# Altium footprint library Dahlia Carrier Board.PcbLib: 99 footprints (part 6 of 7)
Each footprint in its own frame and in the unit in brackets; x right, y up, seen from the top. Pads: shape width x height; smd on the part's side, far side on the other; paste and mask are expansions set on the pad; w line width, h text height; cw(c..) or ccw(c..) is an arc to the next point about the centre after c.
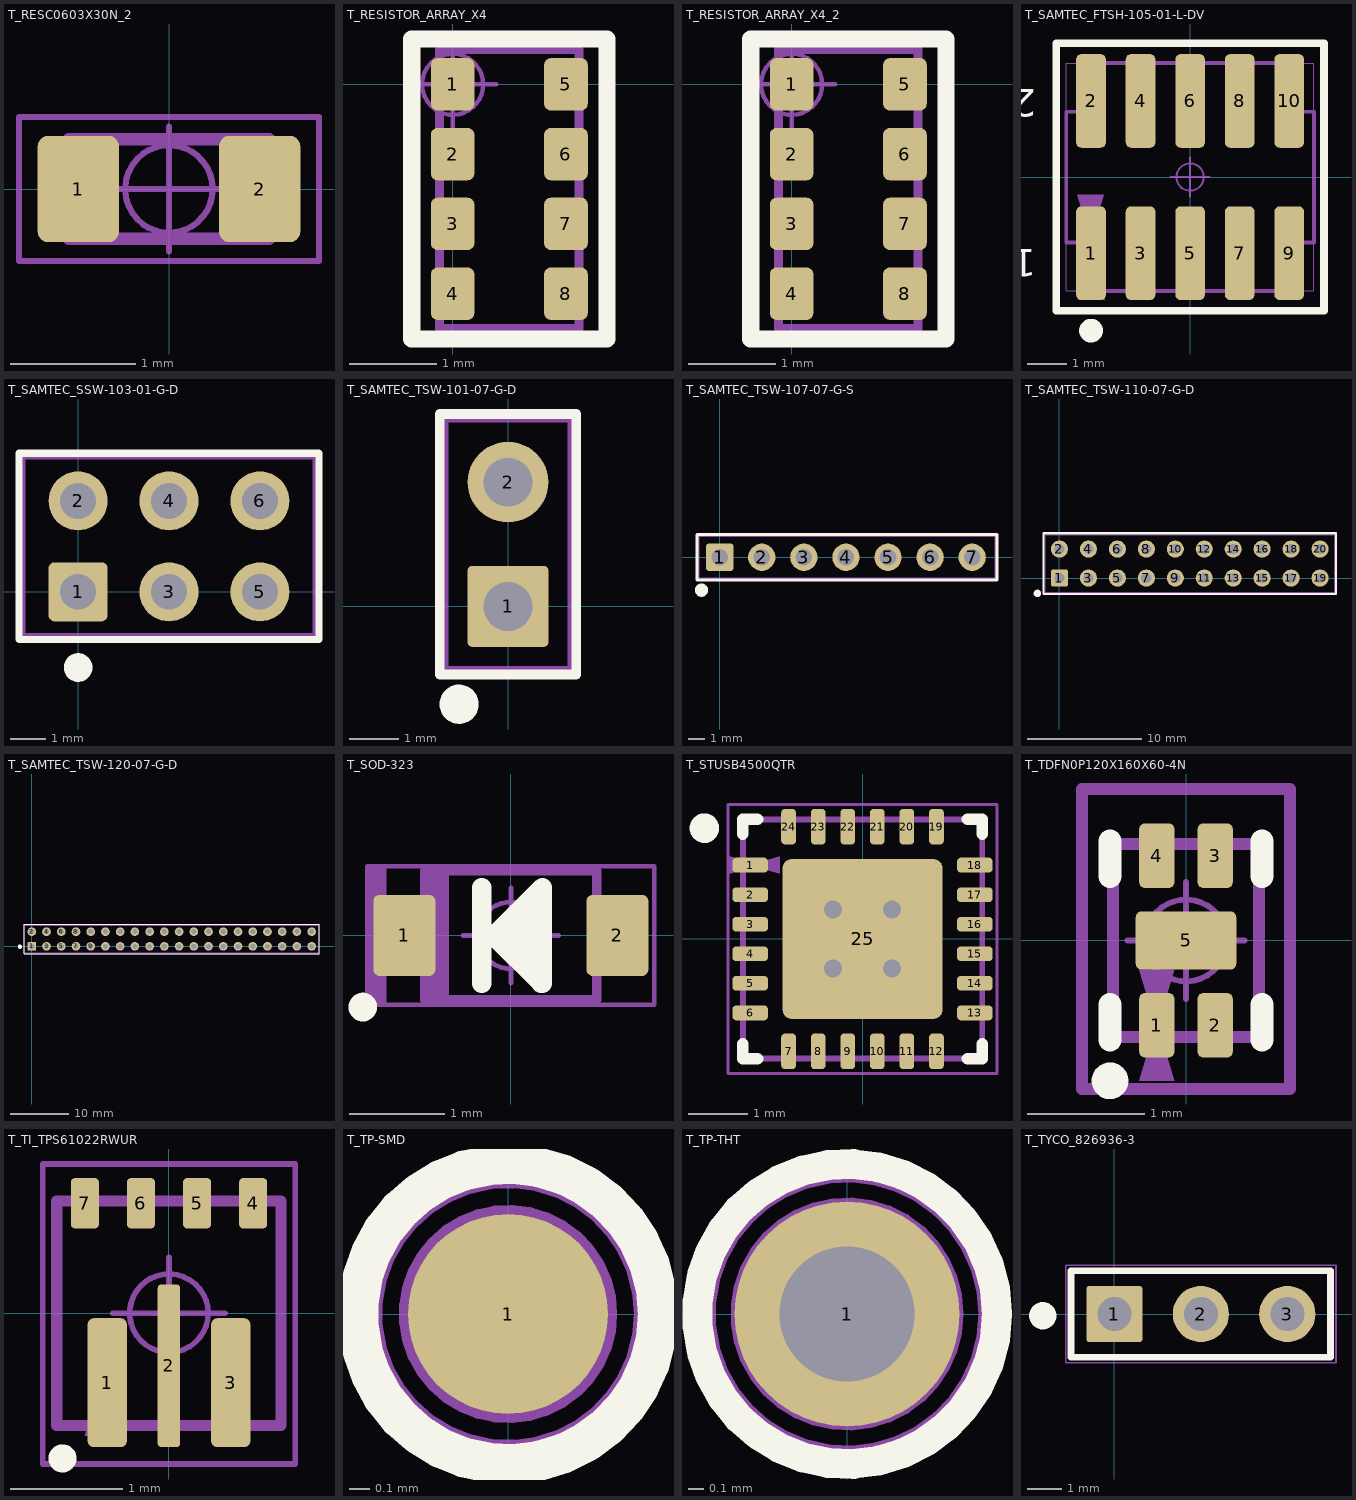
[diagram p5: the footprints below, top view; thin cyan lines are the x and y axes]

## T_RESC0603X30N_2 [mm]
pads (2):
  rrect25% 0.65x0.85 smd: 1(-0.725,0) 2(0.725,0)
Top Component Outline:
  lines w0.05: -1.2,-0.575 -1.2,0.575 1.2,0.575 1.2,-0.575 -1.2,-0.575
Top 3D Body:
  lines w0.001: -0.8,-0.4 -0.8,0.4 0.8,0.4 0.8,-0.4 -0.8,-0.4
Top Dimensions:
  lines w0.1: -0.8,-0.4 -0.8,0.4 0.8,0.4 0.8,-0.4 -0.8,-0.4
Top Component Center:
  circle w0.05: c0,0 r0.35
  lines w0.05: -0.5,0 0.5,0 ; 0,-0.5 0,0.5
Top Assembly:
  text ".Designator" at 0.625,0.25 h0.75
3D body "User Library-RES_1609-0603.step": height 0.56, standoff 0, extent -0.85,-0.4 0.85,0.4

## T_RESISTOR_ARRAY_X4 [mm]
pads (8):
  rrect30% 0.5x0.6 smd: 1(0,0) 2(0,-0.8) 3(0,-1.6) 4(0,-2.4) 5(1.3,0) 6(1.3,-0.8) 7(1.3,-1.6) 8(1.3,-2.4)
Top Overlay:
  lines w0.2: -0.47,-2.92 1.77,-2.92 1.77,0.52 -0.47,0.52 -0.47,-2.92
Top Component Outline:
  lines w0.05: -0.47,-2.92 1.77,-2.92 1.77,0.52 -0.47,0.52 -0.47,-2.92
Top 3D Body:
  lines w0.001: -0.15,-2.8 1.45,-2.8 1.45,0.4 -0.15,0.4 -0.15,-2.8
Top Dimensions:
  lines w0.1: -0.15,-2.8 1.45,-2.8 1.45,0.4 -0.15,0.4 -0.15,-2.8
Top Component Center:
  circle w0.05: c0,0 r0.35
  lines w0.05: -0.5,0 0.5,0 ; 0,-0.5 0,0.5
Top Assembly:
  text ".Designator" at -1,0.8 h0.75
3D body "User Library-R-0603-Array-4-1.STEP": height 0.51, standoff -0.01, extent -0.15,-2.8 1.45,0.4

## T_RESISTOR_ARRAY_X4_2 [mm]
pads (8):
  rrect30% 0.5x0.6 smd: 1(0,0) 2(0,-0.8) 3(0,-1.6) 4(0,-2.4) 5(1.3,0) 6(1.3,-0.8) 7(1.3,-1.6) 8(1.3,-2.4)
Top Overlay:
  lines w0.2: -0.47,-2.92 1.77,-2.92 1.77,0.52 -0.47,0.52 -0.47,-2.92
Top Component Outline:
  lines w0.05: -0.47,-2.92 1.77,-2.92 1.77,0.52 -0.47,0.52 -0.47,-2.92
Top 3D Body:
  lines w0.001: -0.15,-2.8 1.45,-2.8 1.45,0.4 -0.15,0.4 -0.15,-2.8
Top Dimensions:
  lines w0.1: -0.15,-2.8 1.45,-2.8 1.45,0.4 -0.15,0.4 -0.15,-2.8
Top Component Center:
  circle w0.05: c0,0 r0.35
  lines w0.05: -0.5,0 0.5,0 ; 0,-0.5 0,0.5
Top Assembly:
  text ".Designator" at -1,0.8 h0.75
3D body "User Library-R-0603-Array-4-1.STEP": height 0.51, standoff -0.01, extent -0.15,-2.8 1.45,0.4

## T_SAMTEC_FTSH-105-01-L-DV [mm]
height 5.5
pads (10):
  rrect35% 0.76x2.4 smd: 1(-2.54,-1.95) 2(-2.54,1.95) 3(-1.27,-1.95) 4(-1.27,1.95) 5(0,-1.95) 6(0,1.95) 7(1.27,-1.95) 8(1.27,1.95) 9(2.54,-1.95) 10(2.54,1.95)
Top Overlay:
  circle w0.4: c-2.54,-3.937 r0.105
  lines w0.2: -3.429,-3.429 3.429,-3.429 3.429,3.429 -3.429,3.429 -3.429,-3.429
  text "2" at -3.95,2.25 h0.7
  text "1" at -3.95,-1.85 h0.7
Top Component Outline:
  region: -2.185,-3.15 -2.525,-2.015 -2.865,-3.15
  lines w0.05: -3.429,-3.429 3.429,-3.429 3.429,3.429 -3.429,3.429 -3.429,-3.429
Top 3D Body:
  lines w0.001: -3.175,-2.921 3.175,-2.921 3.175,2.921 -3.175,2.921 -3.175,-2.921 ; -3.175,-1.675 -3.175,1.675 -2.55,1.675 -2.55,2.925 2.53,2.925 2.53,1.675 3.175,1.675 3.175,-1.675 2.53,-1.675 2.53,-2.925 -2.55,-2.925 -2.55,-1.675 -3.175,-1.675
Top Dimensions:
  region: -2.89,-0.45 -2.55,-1.585 -2.21,-0.45
  lines w0.1: -3.175,-1.675 -3.175,1.675 -2.55,1.675 -2.55,2.925 2.53,2.925 2.53,1.675 3.175,1.675 3.175,-1.675 2.53,-1.675 2.53,-2.925 -2.55,-2.925 -2.55,-1.675 -3.175,-1.675
Top Component Center:
  circle w0.05: c0,0 r0.35
  lines w0.05: -0.5,0 0.5,0 ; 0,-0.5 0,0.5
Top Assembly:
  text ".Designator" at -0.425,-0.125 h0.75
3D body "FTSH-105-01-L-DV-K_2_14.stp": height 6.1, standoff -0.02, extent -3.175,-2.921 3.175,2.921

## T_SAMTEC_SSW-103-01-G-D [mm]
height 13.83
pads (6):
  rrect20% 1.65x1.65 hole 1: 1(0,0)
  round 1.65 hole 1: 2(0,2.54) 3(2.54,0) 4(2.54,2.54) 5(5.08,0) 6(5.08,2.54)
Top Overlay:
  circle w0.4: c0,-2.115 r0.2
  lines w0.2: -1.65,-1.33 -1.65,3.87 6.73,3.87 6.73,-1.33 -1.65,-1.33
Top Component Outline:
  lines w0.05: -1.625,-1.305 6.705,-1.305 6.705,3.845 -1.625,3.845 -1.625,-1.305
Top 3D Body:
  lines w0.001: -1.525,-1.205 6.605,-1.205 6.605,3.745 -1.525,3.745 -1.525,-1.205
Top Dimensions:
  lines w0.1: -1.525,-1.2 -1.525,3.75 6.6,3.75 6.6,-1.2 -1.525,-1.2
Top Component Center:
  circle w0.05: c0,0 r0.35
  lines w0.05: -0.5,0 0.5,0 ; 0,-0.5 0,0.5
Top Assembly:
  text ".Designator" at 0.875,4.225 h0.75
3D body "Samtec-SSW-103-01-G-D.step": height 8.52, standoff -2.63, extent -1.524,-1.206 6.604,3.747

## T_SAMTEC_TSW-101-07-G-D [mm]
height 5.5
pads (2):
  rrect10% 1.65x1.65 hole 1: 1(0,0)
  round 1.65 hole 1: 2(0,2.54)
Top Overlay:
  circle w0.4: c-1,-2 r0.2
  lines w0.2: -1.395,-1.395 -1.395,3.935 1.395,3.935 1.395,-1.395 -1.395,-1.395
Top Component Outline:
  lines w0.05: -1.37,-1.37 1.37,-1.37 1.37,3.91 -1.37,3.91 -1.37,-1.37
Top 3D Body:
  lines w0.001: -1.27,-1.27 -1.27,3.81 1.27,3.81 1.27,-1.27 -1.27,-1.27
Top Dimensions:
  lines w0.1: -1.27,-1.27 1.27,-1.27 1.27,3.81 -1.27,3.81 -1.27,-1.27
Top Component Center:
  circle w0.05: c0,0 r0.35
  lines w0.05: -0.5,0 0.5,0 ; 0,-0.5 0,0.5
Top Assembly:
  text ".Designator" at -0.27,1.755 h0.75
3D body "Samtec-TSW-101-07-G-D.step": height 8.4, standoff -2.52, extent -1.27,-1.27 1.27,3.81

## T_SAMTEC_TSW-107-07-G-S [mm]
height 13.83
pads (7):
  rrect20% 1.65x1.65 hole 1: 1(0,0)
  round 1.65 hole 1: 2(2.54,0) 3(5.08,0) 4(7.62,0) 5(10.16,0) 6(12.7,0) 7(15.24,0)
Top Overlay:
  circle w0.4: c-1.102,-1.985 r0.2
  lines w0.2: -1.372,-1.372 16.739,-1.372 16.739,1.372 -1.372,1.372 -1.372,-1.372
Top Component Outline:
  lines w0.05: -1.372,-1.372 -1.372,1.372 16.739,1.372 16.739,-1.372 -1.372,-1.372
Top 3D Body:
  lines w0.001: -1.27,-1.27 16.637,-1.27 16.637,1.27 -1.27,1.27 -1.27,-1.27
Top Dimensions:
  lines w0.1: -1.27,-1.27 16.637,-1.27 16.637,1.27 -1.27,1.27 -1.27,-1.27
Top Component Center:
  circle w0.05: c0,0 r0.35
  lines w0.05: -0.5,0 0.5,0 ; 0,-0.5 0,0.5
Top Assembly:
  text ".Designator" at 7.075,-0.465 h0.75
3D body "TSW-107-07-G-S.stp": height 8.38, standoff -2.54, extent -1.27,-1.27 16.637,1.27

## T_SAMTEC_TSW-110-07-G-D [mm]
height 13.83
pads (20):
  rrect20% 1.5x1.5 hole 0.9: 1(0,0)
  round 1.5 hole 0.9: 2(0,2.54) 3(2.54,0) 4(2.54,2.54) 5(5.08,0) 6(5.08,2.54) 7(7.62,0) 8(7.62,2.54) 9(10.16,0) 10(10.16,2.54) 11(12.7,0) 12(12.7,2.54) 13(15.24,0) 14(15.24,2.54) 15(17.78,0) 16(17.78,2.54) 17(20.32,0) 18(20.32,2.54) 19(22.86,0) 20(22.86,2.54)
Top Overlay:
  circle w0.4: c-1.935,-1.35 r0.125
  lines w0.2: -1.395,-1.395 24.257,-1.395 24.257,3.935 -1.395,3.935 -1.395,-1.395
Top Component Outline:
  lines w0.05: -1.37,-1.37 24.257,-1.37 24.257,3.91 -1.37,3.91 -1.37,-1.37
Top 3D Body:
  lines w0.001: -1.27,-1.27 24.13,-1.27 24.13,3.81 -1.27,3.81 -1.27,-1.27
Top Dimensions:
  lines w0.1: -1.27,-1.27 24.13,-1.27 24.13,3.81 -1.27,3.81 -1.27,-1.27
Top Component Center:
  circle w0.05: c0,0 r0.35
  lines w0.05: -0.5,0 0.5,0 ; 0,-0.5 0,0.5
Top Assembly:
  text ".Designator" at 10.54,1.05 h0.75
3D body "Samtec-TSW-110-07-G-D.step": height 8.4, standoff -2.52, extent -1.27,-1.27 24.13,3.81

## T_SAMTEC_TSW-120-07-G-D [mm] "Header, 2x20 Pins, 2.54 mm pitch, male"
height 8.51
pads (40):
  rrect20% 1.5x1.5 hole 0.9: 1(0,0)
  round 1.5 hole 0.9: 2(0,2.54) 3(2.54,0) 4(2.54,2.54) 5(5.08,0) 6(5.08,2.54) 7(7.62,0) 8(7.62,2.54) 9(10.16,0) 10(10.16,2.54) 11(12.7,0) 12(12.7,2.54) 13(15.24,0) 14(15.24,2.54) 15(17.78,0) 16(17.78,2.54) 17(20.32,0) 18(20.32,2.54) 19(22.86,0) 20(22.86,2.54) 21(25.4,0) 22(25.4,2.54) 23(27.94,0) 24(27.94,2.54) 25(30.48,0) 26(30.48,2.54) 27(33.02,0) 28(33.02,2.54) 29(35.56,0) 30(35.56,2.54) 31(38.1,0) 32(38.1,2.54) 33(40.64,0) 34(40.64,2.54) 35(43.18,0) 36(43.18,2.54) 37(45.72,0) 38(45.72,2.54) 39(48.26,0) 40(48.26,2.54)
Top Overlay:
  circle w0.4: c-2.04,-0.05 r0.168
  lines w0.2: -1.27,-1.27 49.53,-1.27 49.53,3.81 -1.27,3.81 -1.27,-1.27
Top Component Outline:
  circle w0.05: c0,0 r0.35
  lines w0.05: -1.27,-1.14 49.53,-1.14 49.53,3.68 -1.27,3.68 -1.27,-1.137 ; -0.5,0 0.5,0 ; 0,-0.5 0,0.5
Top 3D Body:
  lines w0.001: -1.27,-1.27 49.53,-1.27 49.53,3.81 -1.27,3.81 -1.27,-1.27
Top Dimensions:
  lines w0.1: -1.27,-1.245 49.53,-1.245 49.53,3.81 -1.27,3.81 -1.27,-1.245
Top Component Center:
  circle w0.05: c0,0 r0.35
  lines w0.05: -0.5,0 0.5,0 ; 0,-0.5 0,0.5
Top Assembly:
  text ".Designator" at 25.019,4.191 h0.75
3D body "TSW-120-07-G-D_2_14.stp": height 8.38, standoff -2.54, extent -1.27,-1.27 49.53,3.81

## T_SOD-323 [mm]
pads (2):
  rrect20% 0.65x0.85 smd: 1(-1.115,0) 2(1.115,0)
Top Overlay:
  circle w0.2: c-1.55,-0.75 r0.05
  lines w0.2: -0.305,-0.502 -0.305,0.502 ; 0.051,-0.21 0.051,0.197 ; 0.203,-0.351 0.203,0.349 ; 0.318,-0.502 -0.178,-0.006 0.33,0.502 0.33,-0.502
Top Component Outline:
  rectangle: -1.5,-0.725 -1.3,0.725
  lines w0.05: -1.5,-0.725 1.5,-0.725 1.5,0.725 -1.5,0.725 -1.5,-0.725
Top 3D Body:
  lines w0.001: -0.9,-0.2 -1.35,-0.2 -1.35,0.2 -0.9,0.2 ; 0.9,-0.2 1.35,-0.2 1.35,0.2 0.9,0.2 ; -0.9,-0.675 0.9,-0.675 0.9,0.675 -0.9,0.675 -0.9,-0.675
Top Dimensions:
  rectangle: -0.9,-0.675 -0.65,0.675
  lines w0.1: -0.9,-0.675 0.9,-0.675 0.9,0.675 -0.9,0.675 -0.9,-0.675
Top Component Center:
  circle w0.05: c0,0 r0.35
  lines w0.05: -0.5,0 0.5,0 ; 0,-0.5 0,0.5
Top Assembly:
  text ".Designator" at -1.625,0.825 h0.75
3D body "User Library-SOD323.step": height 0.9, standoff -0.09, extent -1.25,-0.625 1.25,0.625

## T_STUSB4500QTR [mm] "PQFN, 24-Leads, Body 4.00x4.00mm, Pitch 0.50mm, Thermal Pad 2.70x2.70mm, IPC Medium Density"
height 1
pads (25):
  rrect50% 0.6x0.25 smd: 1(-1.9,1.25) 2(-1.9,0.75) 3(-1.9,0.25) 4(-1.9,-0.25) 5(-1.9,-0.75) 6(-1.9,-1.25) 13(1.9,-1.25) 14(1.9,-0.75) 15(1.9,-0.25) 16(1.9,0.25) 17(1.9,0.75) 18(1.9,1.25)
  rrect50% 0.25x0.6 smd: 7(-1.25,-1.9) 8(-0.75,-1.9) 9(-0.25,-1.9) 10(0.25,-1.9) 11(0.75,-1.9) 12(1.25,-1.9) 19(1.25,1.9) 20(0.75,1.9) 21(0.25,1.9) 22(-0.25,1.9) 23(-0.75,1.9) 24(-1.25,1.9)
  rrect10% 2.7x2.7 smd paste-2: 25(0,0)
via 0.5,-0.5 diameter 0.6 hole 0.3
via -0.5,-0.5 diameter 0.6 hole 0.3
via 0.5,0.5 diameter 0.6 hole 0.3
via -0.5,0.5 diameter 0.6 hole 0.3
Top Overlay:
  circle w0.25: c-2.675,1.875 r0.125
  lines w0.2: -2.025,-1.775 -2.025,-2.025 -1.775,-2.025 ; -2.025,1.775 -2.025,2.025 -1.775,2.025 ; 1.775,-2.025 2.025,-2.025 2.025,-1.775 ; 1.775,2.025 2.025,2.025 2.025,1.775
Top Paste:
  rectangle: -1.3,0.7 -0.7,1.3
  rectangle: 0.7,0.7 1.3,1.3
  rectangle: -0.3,0.7 0.3,1.3
  rectangle: -0.3,-0.3 0.3,0.3
  rectangle: -1.3,-0.3 -0.7,0.3
  rectangle: 0.7,-0.3 1.3,0.3
  rectangle: -1.3,-1.3 -0.7,-0.7
  rectangle: -0.3,-1.3 0.3,-0.7
  rectangle: 0.7,-1.3 1.3,-0.7
Top Component Outline:
  region: -2.25,1.4 -1.75,1.25 -2.25,1.1
  lines w0.05: -2.275,-2.275 2.275,-2.275 2.275,2.275 -2.275,2.275 -2.275,-2.275
Top 3D Body:
  lines w0.001: -2.025,-2.025 -2.025,2.025 2.025,2.025 2.025,-2.025 -2.025,-2.025
Top Dimensions:
  region: -1.4,1.4 -1.9,1.25 -1.4,1.1
  lines w0.1: -2.025,-2.025 -2.025,2.025 2.025,2.025 2.025,-2.025 -2.025,-2.025
Top Component Center:
  circle w0.05: c0,0 r0.35
  lines w0.05: -0.5,0 0.5,0 ; 0,-0.5 0,0.5
Top Assembly:
  text ".Designator" at -1.1,-0.4 h1.5
3D body "T_STUSB4500QTR.step": height 1, standoff 0, extent -2.025,-2.025 2.025,2.025

## T_TDFN0P120X160X60-4N [mm]
height 13.83
pads (5):
  rrect30% 0.3x0.55 smd: 1(-0.25,-0.725) 2(0.25,-0.725) 3(0.25,0.725) 4(-0.25,0.725)
  rrect20% 0.86x0.5 smd paste-0.05: 5(0,0)
Top Overlay:
  circle w0.175: c-0.65,-1.2 r0.069
  lines w0.2: -0.65,-0.85 -0.65,-0.55 ; -0.65,0.55 -0.65,0.85 ; 0.65,-0.85 0.65,-0.55 ; 0.65,0.55 0.65,0.85
Top Component Outline:
  region: -0.1,-1.2 -0.25,-0.7 -0.4,-1.2
  lines w0.1: -0.889,-1.27 -0.889,1.295 0.889,1.295 0.889,-1.27 -0.889,-1.27
Top Dimensions:
  region: -0.4,-0.25 -0.25,-0.75 -0.1,-0.25
  lines w0.1: -0.625,-0.825 -0.625,0.825 0.625,0.825 0.625,-0.825 -0.625,-0.825
Top Component Center:
  circle w0.05: c0,0 r0.35
  lines w0.05: -0.5,0 0.5,0 ; 0,-0.5 0,0.5
Top Assembly:
  text ".Designator" at 0.7,0.225 h0.75
3D body "test-24.step": height 0.6, standoff 0, extent -0.625,-0.826 0.625,0.826

## T_TI_TPS61022RWUR [mm]
height 1
pads (13):
  rrect30% 0.35x1.15 smd paste-5: 1(-0.55,-0.62) 3(0.55,-0.62)
  rrect30% 0.2x1.45 smd paste-5: 2(0,-0.469)
  rrect30% 0.25x0.45 smd: 4(0.751,0.98) 5(0.25,0.98) 6(-0.25,0.98) 7(-0.75,0.98)
  rrect50% 0.35x0.475 on Top Paste: ""(-0.55,-0.958) ""(-0.55,-0.282) ""(0.55,-0.958) ""(0.55,-0.283)
  rrect50% 0.2x0.625 on Top Paste: ""(-0.001,-0.883) ""(-0.001,-0.058)
Top Overlay:
  circle w0.15: c-0.95,-1.295 r0.05
Top Component Outline:
  region: -0.45,-1.095 -0.6,-0.595 -0.75,-1.095
  lines w0.05: -1.125,-1.345 -1.125,1.33 1.125,1.33 1.125,-1.345 -1.125,-1.345
Top Dimensions:
  region: -0.6,-0.585 -0.718,-0.3 -0.481,-0.3
  lines w0.1: -1,-1 -1,1 1,1 1,-1 -1,-1
Top Component Center:
  circle w0.05: c0,0 r0.35
  lines w0.05: -0.5,0 0.5,0 ; 0,-0.5 0,0.5
Top Assembly:
  text ".Designator" at -0.475,-0.22 h0.75
3D body: height 1, standoff 0, extent -0.999,-0.999 0.999,0.999

## T_TP-SMD [mm]
pads (1):
  round 1 smd: 1(0,0)
Top Overlay:
  circle w0.2: c0,0 r0.75
Top Component Outline:
  circle w0.05: c0,0 r0.654
Top Dimensions:
  circle w0.1: c0,0 r0.496
Top Component Center:
  circle w0.05: c0,0 r0.35
  lines w0.05: -0.5,0 0.5,0 ; 0,-0.5 0,0.5
Top Assembly:
  text ".Designator" at 0.825,-0.775 h0.75

## T_TP-THT [mm]
height 5.5
pads (1):
  round 1.5 hole 0.9: 1(0,0)
Top Overlay:
  circle w0.2: c0,0 r1
Top Component Outline:
  circle w0.05: c0,0 r0.901
Top Dimensions:
  circle w0.05: c0,0 r0.752
Top Component Center:
  circle w0.05: c0,0 r0.35
  lines w0.05: -0.5,0 0.5,0 ; 0,-0.5 0,0.5
Top Assembly:
  text ".Designator" at -1.6,1.25 h0.75

## T_TYCO_826936-3 [mm]
height 5.5
pads (3):
  rrect10% 1.65x1.65 hole 1: 1(0,0)
  round 1.65 hole 1: 2(2.54,0) 3(5.08,0)
Top Overlay:
  circle w0.4: c-2.102,-0.051 r0.2
  lines w0.2: -1.27,-1.27 6.35,-1.27 6.35,1.27 -1.27,1.27 -1.27,-1.27
Top Component Outline:
  lines w0.05: -1.43,-1.43 6.51,-1.43 6.51,1.43 -1.43,1.43 -1.43,-1.43
Top 3D Body:
  lines w0.001: -1.27,-1.27 6.35,-1.27 6.35,1.27 -1.27,1.27 -1.27,-1.27
Top Dimensions:
  lines w0.1: -1.27,-1.27 6.35,-1.27 6.35,1.27 -1.27,1.27 -1.27,-1.27
Top Component Center:
  circle w0.05: c0,0 r0.35
  lines w0.05: -0.5,0 0.5,0 ; 0,-0.5 0,0.5
Top Assembly:
  text ".Designator" at 0.975,1.8 h0.75
3D body "Samtec-TSW-103-07-G-S, Jumper with 3 pins, male.step": height 8.4, standoff -2.52, extent -1.27,-1.27 6.35,1.27